# Altium footprint library RNG_Footprints.PcbLib: 134 footprints (part 2 of 9)
Each footprint in its own frame and in the unit in brackets; x right, y up, seen from the top. Pads: shape width x height; smd on the part's side, far side on the other; paste and mask are expansions set on the pad; w line width, h text height; cw(c..) or ccw(c..) is an arc to the next point about the centre after c.
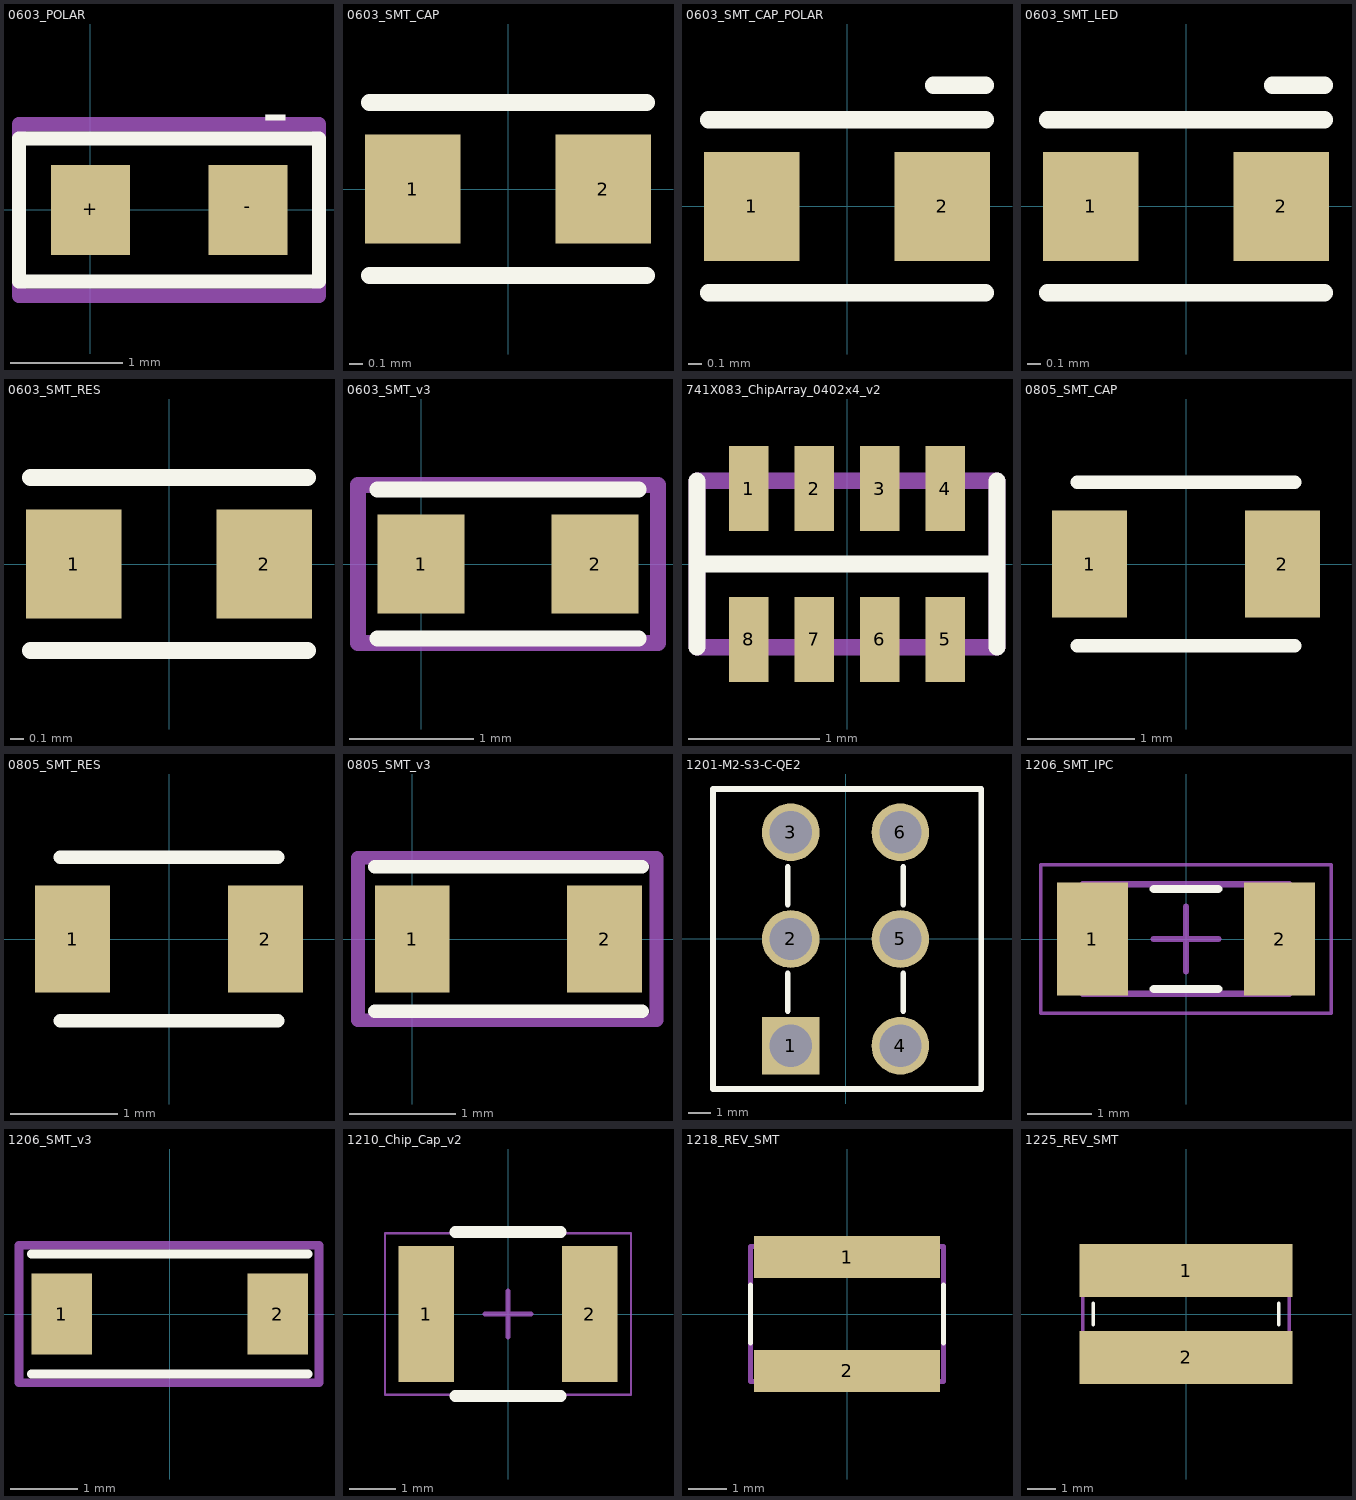
[diagram p1: the footprints below, top view; thin cyan lines are the x and y axes]

## 0603_POLAR [mm] "0603 Chip LED w/ Polarity"
height 0.5
pads (2):
  rect 0.7x0.8 smd: +(0,0) -(1.4,0)
Top Overlay:
  lines w0.127: -0.635,-0.635 2.032,-0.635 2.032,0.635 -0.635,0.635 -0.635,-0.635
  text "-" at 1.524,0.635 h0.5
Mechanical 15:
  lines w0.127: -0.635,-0.762 2.032,-0.762 2.032,0.762 -0.635,0.762 -0.635,-0.762
3D body: height 0.5, standoff 0, extent -0.1,-0.4 1.5,0.4

## 0603_SMT_CAP [mm] "0603 Chip Cap"
height 0.5
pads (2):
  rect 0.7x0.8 smd: 1(-0.7,0) 2(0.7,0)
Top Overlay:
  lines w0.127: -1.016,-0.635 1.016,-0.635 ; -1.016,0.635 1.016,0.635
3D body "SW3dPS-0603 SMD Capacitor.STEP": height 0.31, standoff 0.01, extent -0.8,-0.4 0.8,0.4

## 0603_SMT_CAP_POLAR [mm] "0603 Chip Cap with Polar Placement Marks"
height 0.5
pads (2):
  rect 0.7x0.8 smd: 1(-0.7,0) 2(0.7,0)
Top Overlay:
  lines w0.127: -1.016,-0.635 1.016,-0.635 ; -1.016,0.635 1.016,0.635 ; 0.635,0.889 1.016,0.889
3D body "SW3dPS-0603 SMD Capacitor.STEP": height 0.31, standoff 0.01, extent -0.8,-0.4 0.8,0.4

## 0603_SMT_LED [mm] "0603 Chip Cap with Polar Placement Marks"
height 0.5
pads (2):
  rect 0.7x0.8 smd: 1(-0.7,0) 2(0.7,0)
Top Overlay:
  lines w0.127: -1.016,-0.635 1.016,-0.635 ; -1.016,0.635 1.016,0.635 ; 0.635,0.889 1.016,0.889
3D body "User Library-LTST-C190EKT.STEP": height 0.91, standoff 0.01, extent -0.85,-0.45 0.85,0.45

## 0603_SMT_RES [mm] "0603 Chip Resistor"
height 0.5
pads (2):
  rect 0.7x0.8 smd: 1(-0.7,0) 2(0.7,0)
Top Overlay:
  lines w0.127: -1.016,-0.635 1.016,-0.635 ; -1.016,0.635 1.016,0.635
3D body "SW3dPS-0603 SMD Resistor.STEP": height 0.31, standoff 0.01, extent -0.8,-0.4 0.8,0.4

## 0603_SMT_v3 [mm] "0603 Chip Cap, Res, Ind"
height 0.5
pads (2):
  rect 0.7x0.8 smd: 1(0,0) 2(1.4,0)
Top Overlay:
  lines w0.127: -0.35,-0.6 1.75,-0.6 ; -0.35,0.6 1.75,0.6
Mechanical 15:
  lines w0.127: -0.508,-0.635 -0.508,0.635 1.905,0.635 1.905,-0.635 -0.508,-0.635
3D body: height 0.5, standoff 0, extent -0.1,-0.4 1.5,0.4

## 741X083_ChipArray_0402x4_v2 [mm] "CTS Chip Array, 4x 0402 Parts for 741X083, 741C083 Part Code"
height 0.55
pads (8):
  rect 0.3x0.65 smd paste-0.03 mask+0.05: 1(-0.75,0.575) 2(-0.25,0.575) 3(0.25,0.575) 4(0.75,0.575) 5(0.75,-0.575) 6(0.25,-0.575) 7(-0.25,-0.575) 8(-0.75,-0.575)
Top Overlay:
  lines w0.127: -1.143,-0.635 -1.143,0.635 ; -1.143,0 1.143,0 ; 1.143,-0.635 1.143,0.635
  text "." at -1.143,0.889 h0.5
Mechanical 15:
  lines w0.127: -1.143,-0.635 -1.143,0.635 1.143,0.635 1.143,-0.635 -1.143,-0.635
3D body: height 0.55, standoff 0, extent -1.1,-0.6 1.1,0.6

## 0805_SMT_CAP [mm] "0805 Chip Capacitor"
height 1
pads (2):
  rect 0.7x1 smd: 1(-0.9,0) 2(0.9,0)
Top Overlay:
  lines w0.127: -1.016,-0.762 1.016,-0.762 ; -1.016,0.762 1.016,0.762
3D body "SW3dPS-0805 SMD Capacitor.STEP": height 0.79, standoff 0.01, extent -1,-0.625 1,0.625

## 0805_SMT_RES [mm] "0805 Chip Resistor"
height 1
pads (2):
  rect 0.7x1 smd: 1(-0.9,0) 2(0.9,0)
Top Overlay:
  lines w0.127: -1.016,-0.762 1.016,-0.762 ; -1.016,0.762 1.016,0.762
3D body "SW3dPS-0805 SMD Resistor.STEP": height 0.79, standoff 0.01, extent -1,-0.625 1,0.625

## 0805_SMT_v3 [mm] "0805 Chip Cap, Res, Ind"
height 1
pads (2):
  rect 0.7x1 smd: 1(0,0) 2(1.8,0)
Top Overlay:
  lines w0.127: -0.35,-0.675 2.15,-0.675 ; -0.35,0.675 2.15,0.675
Mechanical 15:
  lines w0.127: -0.508,-0.762 -0.508,0.762 2.286,0.762 2.286,-0.762 -0.508,-0.762
3D body: height 1, standoff 0, extent -0.1,-0.625 1.9,0.625

## 1201-M2-S3-C-QE2 [mil] "C&K 1000 Series DPDT Slide Switch Thru Mount"
height 560
pads (6):
  rect 100x100 hole 73: 1(-95,-185)
  round 100 hole 73: 2(-95,0) 3(-95,185) 4(95,-185) 5(95,0) 6(95,185)
Top Overlay:
  lines w10: -100,-125 -100,-60 ; -100,60 -100,125 ; 100,-125 100,-60 ; 100,60 100,125 ; -230,-260 235,-260 235,260 -230,260 -230,-260
3D body: height 360, standoff 0, extent -225,-250 225,250
3D body: height 560, standoff 360, extent -76,0 76,152

## 1206_SMT_IPC [mm] "Chip Capacitor, 2-Leads, Body 3.10x1.60mm, IPC Medium Density"
height 0.65
pads (2):
  rect 1.1x1.75 smd: 1(-1.45,0) 2(1.45,0)
Top Overlay:
  lines w0.125: -0.5,-0.775 0.5,-0.775 ; -0.5,0.775 0.5,0.775
Mechanical 13:
  lines w0.1: -1.6,-0.85 -1.6,0.85 1.6,0.85 1.6,-0.85 -1.6,-0.85
Mechanical 15:
  lines w0.05: -2.25,-1.15 -2.25,1.15 2.25,1.15 2.25,-1.15 -2.25,-1.15
  lines w0.1: -0.5,0 0.5,0 ; 0,-0.5 0,0.5
3D body: height 0.65, standoff 0, extent -1.6,-0.85 -1.2,0.85
3D body: height 0.65, standoff 0, extent 1.2,-0.85 1.6,0.85
3D body "CAP1206.stp": height 1, standoff 0, extent -1.6,-0.8 1.6,0.8

## 1206_SMT_v3 [mm] "1206 Chip Cap, Res, Ind"
height 2
pads (2):
  rect 0.9x1.2 smd: 1(-1.6,0) 2(1.6,0)
Top Overlay:
  lines w0.127: -2.05,-0.889 2.05,-0.889 ; -2.05,0.889 2.05,0.889
Mechanical 15:
  lines w0.127: -2.235,-1.016 2.21,-1.016 2.21,1.016 -2.235,1.016 -2.235,-1.016
3D body "CAP1206.stp": height 1, standoff 0, extent -1.6,-0.8 1.6,0.8

## 1210_Chip_Cap_v2 [mm] "Chip Capacitor, 2-Leads, Body 3.05x2.54mm, IPC Medium Density"
height 2.54
pads (2):
  rect 1.2x2.95 smd: 1(-1.775,0) 2(1.775,0)
Top Overlay:
  lines w0.254: -1.143,-1.778 1.143,-1.778 ; -1.143,1.778 1.143,1.778
Mechanical 15:
  lines w0.05: -2.667,-1.75 -2.667,1.75 2.667,1.75 2.667,-1.75 -2.667,-1.75
  lines w0.1: -0.5,0 0.5,0 ; 0,-0.5 0,0.5
3D body "User Library-cap_1210.STEP": height 2.51, standoff 0.01, extent -1.6,-1.25 1.6,1.25

## 1218_REV_SMT [mm] "1218 Reversed-Orientation SMT Vishay Footprint"
height 0.6
pads (2):
  rect 4.9x1.1 smd paste-0.05 mask+0.05: 1(0,1.5) 2(0,-1.5)
Top Overlay:
  lines w0.127: -2.54,-0.762 -2.54,0.762 ; 2.54,-0.762 2.54,0.762
Mechanical 15:
  lines w0.127: -2.54,-1.778 -2.54,1.778 2.54,1.778 2.54,-1.778 -2.54,-1.778
3D body: height 0.6, standoff 0, extent -2.375,-1.65 2.375,1.65

## 1225_REV_SMT [mm] "1225 SMT Reversed-Orientation Land Pattern"
height 0.9
pads (2):
  rect 7.6x1.9 smd paste-0.05 mask+0.05: 1(0,1.55) 2(0,-1.55)
Top Overlay:
  lines w0.127: -3.302,-0.381 -3.302,0.381 ; 3.302,-0.381 3.302,0.381
Mechanical 15:
  lines w0.127: -3.683,-1.905 3.683,-1.905 3.683,1.905 -3.683,1.905 -3.683,0 -3.683,-1.905
3D body: height 0.9, standoff 0, extent -3.25,-1.7 3.25,1.7